# Altium schematic symbol library jlcpcb_2025_04_capacitors_extended_1210.schlib: 709 symbols (part 1 of 4) (continued)
## 1210B684K101CT
designator C?  Capacitance: 680nF  (hidden comment: *)
Capacitor, Ceramic (MLCC), 680nF, ±10%, 100V, X7R, ±10%, SMD 1210; Manufacturer: Walsin Tech Corp; Manufacturer Part Number: 1210B684K101CT; Package Size: 1210; JLCPCB Basic Part: No; JLCPCB Part Number: C2992624; Supplier 1: LCSC; Category: Capacitors - MLCC; Supplier Part Number 1: C2992624; Tolerance: ±10%; Voltage Rating: 100V; Temperature Coefficient: X7R; RoHS: Yes; ComponentLink1Description: Datasheet; ComponentLink1URL: https://wmsc.lcsc.com/wmsc/upload/file/pdf/v2/lcsc/2204121445_Walsin-Tech-Corp-1210B684K101CT_C2992624.pdf; ComponentLink2Description: JLCPCB Part URL; ComponentLink2URL: https://jlcpcb.com/partdetail/C2992624; ComponentLink3Description: LCSC Part URL; ComponentLink3URL: https://lcsc.com/product-detail/Multilayer-Ceramic-Capacitors-MLCC---SMD-SMT_Walsin-Tech-Corp-Walsin-Tech-Corp-1210B684K101CT_C2992624.html
footprint CAP-1210 (1210 (3225M) Capacitor)
pins: 1, 2

## 1210CG102J501NT
designator C?  Capacitance: 1nF  (hidden comment: *)
Capacitor, Ceramic (MLCC), 1nF, 500V, C0G, SMD 1210; Manufacturer: FH (Guangdong Fenghua Advanced Tech); Manufacturer Part Number: 1210CG102J501NT; Package Size: 1210; JLCPCB Basic Part: No; JLCPCB Part Number: C3037675; Supplier 1: LCSC; Category: Capacitors - MLCC; Supplier Part Number 1: C3037675; Voltage Rating: 500V; Temperature Coefficient: C0G; RoHS: Yes; ComponentLink1Description: Datasheet; ComponentLink1URL: https://wmsc.lcsc.com/wmsc/upload/file/pdf/v2/lcsc/2206171645_FH--Guangdong-Fenghua-Advanced-Tech-1210CG102J501NT_C3037675.pdf; ComponentLink2Description: JLCPCB Part URL; ComponentLink2URL: https://jlcpcb.com/partdetail/C3037675; ComponentLink3Description: LCSC Part URL; ComponentLink3URL: https://lcsc.com/product-detail/Multilayer-Ceramic-Capacitors-MLCC---SMD-SMT_FH-Guangdong-Fenghua-Advanced-Tech-FH-Guangdong-Fenghua-Advanced-Tech-1210CG102J501NT_C3037675.html
footprint CAP-1210 (1210 (3225M) Capacitor)
pins: 1, 2

## 1210CG681J102NT
designator C?  Capacitance: 680pF  (hidden comment: *)
Capacitor, Ceramic (MLCC), 680pF, ±5%, 1kV, C0G, ±5%, SMD 1210; Manufacturer: FH (Guangdong Fenghua Advanced Tech); Manufacturer Part Number: 1210CG681J102NT; Package Size: 1210; JLCPCB Basic Part: No; JLCPCB Part Number: C3037676; Supplier 1: LCSC; Category: Capacitors - MLCC; Supplier Part Number 1: C3037676; Tolerance: ±5%; Voltage Rating: 1kV; Temperature Coefficient: C0G; RoHS: Yes; ComponentLink1Description: Datasheet; ComponentLink1URL: https://wmsc.lcsc.com/wmsc/upload/file/pdf/v2/lcsc/2206171645_FH--Guangdong-Fenghua-Advanced-Tech-1210CG681J102NT_C3037676.pdf; ComponentLink2Description: JLCPCB Part URL; ComponentLink2URL: https://jlcpcb.com/partdetail/C3037676; ComponentLink3Description: LCSC Part URL; ComponentLink3URL: https://lcsc.com/product-detail/Multilayer-Ceramic-Capacitors-MLCC---SMD-SMT_FH-Guangdong-Fenghua-Advanced-Tech-FH-Guangdong-Fenghua-Advanced-Tech-1210CG681J102NT_C3037676.html
footprint CAP-1210 (1210 (3225M) Capacitor)
pins: 1, 2

## 1210DD105KAT2A
designator C?  Capacitance: 1uF  (hidden comment: *)
Capacitor, Ceramic (MLCC), 1uF, ±10%, 35V, X5R, ±10%, SMD 1210; Manufacturer: Kyocera AVX; Manufacturer Part Number: 1210DD105KAT2A; Package Size: 1210; JLCPCB Basic Part: No; JLCPCB Part Number: C2175253; Supplier 1: LCSC; Category: Capacitors - MLCC; Supplier Part Number 1: C2175253; Tolerance: ±10%; Voltage Rating: 35V; Temperature Coefficient: X5R; RoHS: Yes; ComponentLink1Description: Datasheet; ComponentLink1URL: https://wmsc.lcsc.com/wmsc/upload/file/pdf/v2/lcsc/2304140030_Kyocera-AVX-1210DD105KAT2A_C2175253.pdf; ComponentLink2Description: JLCPCB Part URL; ComponentLink2URL: https://jlcpcb.com/partdetail/C2175253; ComponentLink3Description: LCSC Part URL; ComponentLink3URL: https://lcsc.com/product-detail/Multilayer-Ceramic-Capacitors-MLCC---SMD-SMT_Kyocera-AVX-Kyocera-AVX-1210DD105KAT2A_C2175253.html
footprint CAP-1210 (1210 (3225M) Capacitor)
pins: 1, 2

## 1210F106M100NT
designator C?  Capacitance: 10uF  (hidden comment: *)
Capacitor, Ceramic (MLCC), 10uF, ±20%, 10V, ±20%, SMD 1210; Manufacturer: FH(Guangdong Fenghua Advanced Tech); Manufacturer Part Number: 1210F106M100NT; Package Size: 1210; JLCPCB Basic Part: No; JLCPCB Part Number: C967607; Supplier 1: LCSC; Category: Capacitors - MLCC; Supplier Part Number 1: C967607; Tolerance: ±20%; Voltage Rating: 10V; RoHS: Yes; ComponentLink1Description: Datasheet; ComponentLink1URL: https://wmsc.lcsc.com/wmsc/upload/file/pdf/v2/lcsc/2304140030_FH--Guangdong-Fenghua-Advanced-Tech-1210F106M100NT_C967607.pdf; ComponentLink2Description: JLCPCB Part URL; ComponentLink2URL: https://jlcpcb.com/partdetail/C967607; ComponentLink3Description: LCSC Part URL; ComponentLink3URL: https://lcsc.com/product-detail/Multilayer-Ceramic-Capacitors-MLCC---SMD-SMT_FH-Guangdong-Fenghua-Advanced-Tech-FH-Guangdong-Fenghua-Advanced-Tech-1210F106M100NT_C967607.html
footprint CAP-1210 (1210 (3225M) Capacitor)
pins: 1, 2

## 1210F106M160NT
designator C?  Capacitance: 10uF  (hidden comment: *)
Capacitor, Ceramic (MLCC), 10uF, ±20%, 16V, Y5V, ±20%, SMD 1210; Manufacturer: FH(Guangdong Fenghua Advanced Tech); Manufacturer Part Number: 1210F106M160NT; Package Size: 1210; JLCPCB Basic Part: No; JLCPCB Part Number: C161634; Supplier 1: LCSC; Category: Capacitors - MLCC; Supplier Part Number 1: C161634; Tolerance: ±20%; Voltage Rating: 16V; Temperature Coefficient: Y5V; RoHS: Yes; ComponentLink1Description: Datasheet; ComponentLink1URL: https://wmsc.lcsc.com/wmsc/upload/file/pdf/v2/lcsc/2304140030_FH--Guangdong-Fenghua-Advanced-Tech-1210F106M160NT_C161634.pdf; ComponentLink2Description: JLCPCB Part URL; ComponentLink2URL: https://jlcpcb.com/partdetail/C161634; ComponentLink3Description: LCSC Part URL; ComponentLink3URL: https://lcsc.com/product-detail/Multilayer-Ceramic-Capacitors-MLCC---SMD-SMT_FH-Guangdong-Fenghua-Advanced-Tech-FH-Guangdong-Fenghua-Advanced-Tech-1210F106M160NT_C161634.html
footprint CAP-1210 (1210 (3225M) Capacitor)
pins: 1, 2

## 1210F106M250NT
designator C?  Capacitance: 10uF  (hidden comment: *)
Capacitor, Ceramic (MLCC), 10uF, ±20%, 25V, Y5V, ±20%, SMD 1210; Manufacturer: FH(Guangdong Fenghua Advanced Tech); Manufacturer Part Number: 1210F106M250NT; Package Size: 1210; JLCPCB Basic Part: No; JLCPCB Part Number: C161633; Supplier 1: LCSC; Category: Capacitors - MLCC; Supplier Part Number 1: C161633; Tolerance: ±20%; Voltage Rating: 25V; Temperature Coefficient: Y5V; RoHS: Yes; ComponentLink1Description: Datasheet; ComponentLink1URL: https://wmsc.lcsc.com/wmsc/upload/file/pdf/v2/lcsc/2304140030_FH--Guangdong-Fenghua-Advanced-Tech-1210F106M250NT_C161633.pdf; ComponentLink2Description: JLCPCB Part URL; ComponentLink2URL: https://jlcpcb.com/partdetail/C161633; ComponentLink3Description: LCSC Part URL; ComponentLink3URL: https://lcsc.com/product-detail/Multilayer-Ceramic-Capacitors-MLCC---SMD-SMT_FH-Guangdong-Fenghua-Advanced-Tech-FH-Guangdong-Fenghua-Advanced-Tech-1210F106M250NT_C161633.html
footprint CAP-1210 (1210 (3225M) Capacitor)
pins: 1, 2

## 1210F106M500NT
designator C?  Capacitance: 10uF  (hidden comment: *)
Capacitor, Ceramic (MLCC), 10uF, ±20%, 50V, Y5V, ±20%, SMD 1210; Manufacturer: FH(Guangdong Fenghua Advanced Tech); Manufacturer Part Number: 1210F106M500NT; Package Size: 1210; JLCPCB Basic Part: No; JLCPCB Part Number: C171750; Supplier 1: LCSC; Category: Capacitors - MLCC; Supplier Part Number 1: C171750; Tolerance: ±20%; Voltage Rating: 50V; Temperature Coefficient: Y5V; RoHS: Yes; ComponentLink1Description: Datasheet; ComponentLink1URL: https://wmsc.lcsc.com/wmsc/upload/file/pdf/v2/lcsc/2304140030_FH--Guangdong-Fenghua-Advanced-Tech-1210F106M500NT_C171750.pdf; ComponentLink2Description: JLCPCB Part URL; ComponentLink2URL: https://jlcpcb.com/partdetail/C171750; ComponentLink3Description: LCSC Part URL; ComponentLink3URL: https://lcsc.com/product-detail/Multilayer-Ceramic-Capacitors-MLCC---SMD-SMT_FH-Guangdong-Fenghua-Advanced-Tech-FH-Guangdong-Fenghua-Advanced-Tech-1210F106M500NT_C171750.html
footprint CAP-1210 (1210 (3225M) Capacitor)
pins: 1, 2

## 1210F226M250NT
designator C?  Capacitance: 22uF  (hidden comment: *)
Capacitor, Ceramic (MLCC), 22uF, ±20%, 25V, Y5V, ±20%, SMD 1210; Manufacturer: FH(Guangdong Fenghua Advanced Tech); Manufacturer Part Number: 1210F226M250NT; Package Size: 1210; JLCPCB Basic Part: No; JLCPCB Part Number: C165877; Supplier 1: LCSC; Category: Capacitors - MLCC; Supplier Part Number 1: C165877; Tolerance: ±20%; Voltage Rating: 25V; Temperature Coefficient: Y5V; RoHS: Yes; ComponentLink1Description: Datasheet; ComponentLink1URL: https://wmsc.lcsc.com/wmsc/upload/file/pdf/v2/lcsc/2304140030_FH--Guangdong-Fenghua-Advanced-Tech-1210F226M250NT_C165877.pdf; ComponentLink2Description: JLCPCB Part URL; ComponentLink2URL: https://jlcpcb.com/partdetail/C165877; ComponentLink3Description: LCSC Part URL; ComponentLink3URL: https://lcsc.com/product-detail/Multilayer-Ceramic-Capacitors-MLCC---SMD-SMT_FH-Guangdong-Fenghua-Advanced-Tech-FH-Guangdong-Fenghua-Advanced-Tech-1210F226M250NT_C165877.html
footprint CAP-1210 (1210 (3225M) Capacitor)
pins: 1, 2

## 1210F475Z500CT
designator C?  Capacitance: 4.7uF  (hidden comment: *)
Capacitor, Ceramic (MLCC), 4.7uF, 50V, Y5V, SMD 1210; Manufacturer: Walsin Tech Corp; Manufacturer Part Number: 1210F475Z500CT; Temperature Rating: -20%~+80%; Package Size: 1210; JLCPCB Basic Part: No; JLCPCB Part Number: C515689; Supplier 1: LCSC; Category: Capacitors - MLCC; Supplier Part Number 1: C515689; Voltage Rating: 50V; Temperature Coefficient: Y5V; RoHS: Yes; ComponentLink1Description: Datasheet; ComponentLink1URL: https://wmsc.lcsc.com/wmsc/upload/file/pdf/v2/lcsc/2304140030_Walsin-Tech-Corp-1210F475Z500CT_C515689.pdf; ComponentLink2Description: JLCPCB Part URL; ComponentLink2URL: https://jlcpcb.com/partdetail/C515689; ComponentLink3Description: LCSC Part URL; ComponentLink3URL: https://lcsc.com/product-detail/Multilayer-Ceramic-Capacitors-MLCC---SMD-SMT_Walsin-Tech-Corp-Walsin-Tech-Corp-1210F475Z500CT_C515689.html
footprint CAP-1210 (1210 (3225M) Capacitor)
pins: 1, 2

## 1210GC102KAT1A
designator C?  Capacitance: 1nF  (hidden comment: *)
Capacitor, Ceramic (MLCC), 1nF, ±10%, 2kV, X7R, ±10%, SMD 1210; Manufacturer: AVX; Manufacturer Part Number: 1210GC102KAT1A; Package Size: 1210; JLCPCB Basic Part: No; JLCPCB Part Number: C597599; Supplier 1: LCSC; Category: Capacitors - MLCC; Supplier Part Number 1: C597599; Tolerance: ±10%; Voltage Rating: 2kV; Temperature Coefficient: X7R; RoHS: Yes; ComponentLink1Description: Datasheet; ComponentLink1URL: https://wmsc.lcsc.com/wmsc/upload/file/pdf/v2/lcsc/2304140030_Kyocera-AVX-1210GC102KAT1A_C597599.pdf; ComponentLink2Description: JLCPCB Part URL; ComponentLink2URL: https://jlcpcb.com/partdetail/C597599; ComponentLink3Description: LCSC Part URL; ComponentLink3URL: https://lcsc.com/product-detail/Multilayer-Ceramic-Capacitors-MLCC---SMD-SMT_Kyocera-AVX-Kyocera-AVX-1210GC102KAT1A_C597599.html
footprint CAP-1210 (1210 (3225M) Capacitor)
pins: 1, 2

## 1210GC102KAT2A
designator C?  Capacitance: 1nF  (hidden comment: *)
Capacitor, Ceramic (MLCC), 1nF, ±10%, 2kV, X7R, ±10%, SMD 1210; Manufacturer: Kyocera AVX; Manufacturer Part Number: 1210GC102KAT2A; Package Size: 1210; JLCPCB Basic Part: No; JLCPCB Part Number: C2173108; Supplier 1: LCSC; Category: Capacitors - MLCC; Supplier Part Number 1: C2173108; Tolerance: ±10%; Voltage Rating: 2kV; Temperature Coefficient: X7R; RoHS: Yes; ComponentLink1Description: Datasheet; ComponentLink1URL: https://wmsc.lcsc.com/wmsc/upload/file/pdf/v2/lcsc/2309151035_Kyocera-AVX-1210GC102KAT2A_C2173108.pdf; ComponentLink2Description: JLCPCB Part URL; ComponentLink2URL: https://jlcpcb.com/partdetail/C2173108; ComponentLink3Description: LCSC Part URL; ComponentLink3URL: https://lcsc.com/product-detail/Multilayer-Ceramic-Capacitors-MLCC---SMD-SMT_Kyocera-AVX-Kyocera-AVX-1210GC102KAT2A_C2173108.html
footprint CAP-1210 (1210 (3225M) Capacitor)
pins: 1, 2

## 1210J6300473KXT
designator C?  Capacitance: 47nF  (hidden comment: *)
Capacitor, Ceramic (MLCC), 47nF, ±10%, 630V, X7R, ±10%, SMD 1210; Manufacturer: Knowles; Manufacturer Part Number: 1210J6300473KXT; Package Size: 1210; JLCPCB Basic Part: No; JLCPCB Part Number: C340572; Supplier 1: LCSC; Category: Capacitors - MLCC; Supplier Part Number 1: C340572; Tolerance: ±10%; Voltage Rating: 630V; Temperature Coefficient: X7R; RoHS: Yes; ComponentLink1Description: Datasheet; ComponentLink1URL: https://wmsc.lcsc.com/wmsc/upload/file/pdf/v2/lcsc/1912111437_Knowles-1210J6300473KXT_C340572.pdf; ComponentLink2Description: JLCPCB Part URL; ComponentLink2URL: https://jlcpcb.com/partdetail/C340572; ComponentLink3Description: LCSC Part URL; ComponentLink3URL: https://lcsc.com/product-detail/Multilayer-Ceramic-Capacitors-MLCC---SMD-SMT_Knowles-Knowles-1210J6300473KXT_C340572.html
footprint CAP-1210 (1210 (3225M) Capacitor)
pins: 1, 2

## 1210J6300683KJT
designator C?  Capacitance: 68nF  (hidden comment: *)
Capacitor, Ceramic (MLCC), 68nF, ±10%, 630V, X7R, ±10%, SMD 1210; Manufacturer: Knowles; Manufacturer Part Number: 1210J6300683KJT; Package Size: 1210; JLCPCB Basic Part: No; JLCPCB Part Number: C340540; Supplier 1: LCSC; Category: Capacitors - MLCC; Supplier Part Number 1: C340540; Tolerance: ±10%; Voltage Rating: 630V; Temperature Coefficient: X7R; RoHS: Yes; ComponentLink1Description: Datasheet; ComponentLink1URL: https://wmsc.lcsc.com/wmsc/upload/file/pdf/v2/lcsc/1912111437_Knowles-1210J6300683KJT_C340540.pdf; ComponentLink2Description: JLCPCB Part URL; ComponentLink2URL: https://jlcpcb.com/partdetail/C340540; ComponentLink3Description: LCSC Part URL; ComponentLink3URL: https://lcsc.com/product-detail/Multilayer-Ceramic-Capacitors-MLCC---SMD-SMT_Knowles-Knowles-1210J6300683KJT_C340540.html
footprint CAP-1210 (1210 (3225M) Capacitor)
pins: 1, 2

## 1210N151J202CT
designator C?  Capacitance: 150pF  (hidden comment: *)
Capacitor, Ceramic (MLCC), 150pF, ±5%, 2kV, NP0, ±5%, SMD 1210; Manufacturer: Walsin Tech Corp; Manufacturer Part Number: 1210N151J202CT; Package Size: 1210; JLCPCB Basic Part: No; JLCPCB Part Number: C880764; Supplier 1: LCSC; Category: Capacitors - MLCC; Supplier Part Number 1: C880764; Tolerance: ±5%; Voltage Rating: 2kV; Temperature Coefficient: NP0; RoHS: Yes; ComponentLink1Description: Datasheet; ComponentLink1URL: https://wmsc.lcsc.com/wmsc/upload/file/pdf/v2/lcsc/2304140030_Walsin-Tech-Corp-1210N151J202CT_C880764.pdf; ComponentLink2Description: JLCPCB Part URL; ComponentLink2URL: https://jlcpcb.com/partdetail/C880764; ComponentLink3Description: LCSC Part URL; ComponentLink3URL: https://lcsc.com/product-detail/Multilayer-Ceramic-Capacitors-MLCC---SMD-SMT_Walsin-Tech-Corp-Walsin-Tech-Corp-1210N151J202CT_C880764.html
footprint CAP-1210 (1210 (3225M) Capacitor)
pins: 1, 2

## 1210N221J102CT
designator C?  Capacitance: 220pF  (hidden comment: *)
Capacitor, Ceramic (MLCC), 220pF, ±5%, 1kV, NP0, ±5%, SMD 1210; Manufacturer: Walsin Tech Corp; Manufacturer Part Number: 1210N221J102CT; Package Size: 1210; JLCPCB Basic Part: No; JLCPCB Part Number: C396817; Supplier 1: LCSC; Category: Capacitors - MLCC; Supplier Part Number 1: C396817; Tolerance: ±5%; Voltage Rating: 1kV; Temperature Coefficient: NP0; RoHS: Yes; ComponentLink1Description: Datasheet; ComponentLink1URL: https://wmsc.lcsc.com/wmsc/upload/file/pdf/v2/lcsc/2304140030_Walsin-Tech-Corp-1210N221J102CT_C396817.pdf; ComponentLink2Description: JLCPCB Part URL; ComponentLink2URL: https://jlcpcb.com/partdetail/C396817; ComponentLink3Description: LCSC Part URL; ComponentLink3URL: https://lcsc.com/product-detail/Multilayer-Ceramic-Capacitors-MLCC---SMD-SMT_Walsin-Tech-Corp-Walsin-Tech-Corp-1210N221J102CT_C396817.html
footprint CAP-1210 (1210 (3225M) Capacitor)
pins: 1, 2

## 1210N221J500CT
designator C?  Capacitance: 220pF  (hidden comment: *)
Capacitor, Ceramic (MLCC), 220pF, ±5%, 50V, NP0, ±5%, SMD 1210; Manufacturer: Walsin Tech Corp; Manufacturer Part Number: 1210N221J500CT; Package Size: 1210; JLCPCB Basic Part: No; JLCPCB Part Number: C469649; Supplier 1: LCSC; Category: Capacitors - MLCC; Supplier Part Number 1: C469649; Tolerance: ±5%; Voltage Rating: 50V; Temperature Coefficient: NP0; RoHS: Yes; ComponentLink1Description: Datasheet; ComponentLink1URL: https://wmsc.lcsc.com/wmsc/upload/file/pdf/v2/lcsc/2304140030_Walsin-Tech-Corp-1210N221J500CT_C469649.pdf; ComponentLink2Description: JLCPCB Part URL; ComponentLink2URL: https://jlcpcb.com/partdetail/C469649; ComponentLink3Description: LCSC Part URL; ComponentLink3URL: https://lcsc.com/product-detail/Multilayer-Ceramic-Capacitors-MLCC---SMD-SMT_Walsin-Tech-Corp-Walsin-Tech-Corp-1210N221J500CT_C469649.html
footprint CAP-1210 (1210 (3225M) Capacitor)
pins: 1, 2

## 1210X106K160CT
designator C?  Capacitance: 10uF  (hidden comment: *)
Capacitor, Ceramic (MLCC), 10uF, ±10%, 16V, X5R, ±10%, SMD 1210; Manufacturer: Walsin Tech Corp; Manufacturer Part Number: 1210X106K160CT; Package Size: 1210; JLCPCB Basic Part: No; JLCPCB Part Number: C304026; Supplier 1: LCSC; Category: Capacitors - MLCC; Supplier Part Number 1: C304026; Tolerance: ±10%; Voltage Rating: 16V; Temperature Coefficient: X5R; RoHS: Yes; ComponentLink1Description: Datasheet; ComponentLink1URL: https://wmsc.lcsc.com/wmsc/upload/file/pdf/v2/lcsc/2304140030_Walsin-Tech-Corp-1210X106K160CT_C304026.pdf; ComponentLink2Description: JLCPCB Part URL; ComponentLink2URL: https://jlcpcb.com/partdetail/C304026; ComponentLink3Description: LCSC Part URL; ComponentLink3URL: https://lcsc.com/product-detail/Multilayer-Ceramic-Capacitors-MLCC---SMD-SMT_Walsin-Tech-Corp-Walsin-Tech-Corp-1210X106K160CT_C304026.html
footprint CAP-1210 (1210 (3225M) Capacitor)
pins: 1, 2

## 1210X106K160NT
designator C?  Capacitance: 10000000pF  (hidden comment: *)
Capacitor, Ceramic (MLCC), 10000000pF, ±10%, 16V, X5R, ±10%, SMD 1210; Manufacturer: FH (Guangdong Fenghua Advanced Tech); Manufacturer Part Number: 1210X106K160NT; Package Size: 1210; JLCPCB Basic Part: No; JLCPCB Part Number: C962232; Supplier 1: LCSC; Category: Capacitors - MLCC; Supplier Part Number 1: C962232; Tolerance: ±10%; Voltage Rating: 16V; Temperature Coefficient: X5R; RoHS: Yes; ComponentLink1Description: Datasheet; ComponentLink1URL: https://wmsc.lcsc.com/wmsc/upload/file/pdf/v2/lcsc/2304140030_FH--Guangdong-Fenghua-Advanced-Tech-1210X106K160NT_C962232.pdf; ComponentLink2Description: JLCPCB Part URL; ComponentLink2URL: https://jlcpcb.com/partdetail/C962232; ComponentLink3Description: LCSC Part URL; ComponentLink3URL: https://lcsc.com/product-detail/Multilayer-Ceramic-Capacitors-MLCC---SMD-SMT_FH-Guangdong-Fenghua-Advanced-Tech-FH-Guangdong-Fenghua-Advanced-Tech-1210X106K160NT_C962232.html
footprint CAP-1210 (1210 (3225M) Capacitor)
pins: 1, 2

## 1210X106K250CT
designator C?  Capacitance: 10uF  (hidden comment: *)
Capacitor, Ceramic (MLCC), 10uF, ±10%, 25V, X5R, ±10%, SMD 1210; Manufacturer: Walsin Tech Corp; Manufacturer Part Number: 1210X106K250CT; Package Size: 1210; JLCPCB Basic Part: No; JLCPCB Part Number: C2909421; Supplier 1: LCSC; Category: Capacitors - MLCC; Supplier Part Number 1: C2909421; Tolerance: ±10%; Voltage Rating: 25V; Temperature Coefficient: X5R; RoHS: Yes; ComponentLink1Description: Datasheet; ComponentLink1URL: https://wmsc.lcsc.com/wmsc/upload/file/pdf/v2/lcsc/2110272130_Walsin-Tech-Corp-1210X106K250CT_C2909421.pdf; ComponentLink2Description: JLCPCB Part URL; ComponentLink2URL: https://jlcpcb.com/partdetail/C2909421; ComponentLink3Description: LCSC Part URL; ComponentLink3URL: https://lcsc.com/product-detail/Multilayer-Ceramic-Capacitors-MLCC---SMD-SMT_Walsin-Tech-Corp-Walsin-Tech-Corp-1210X106K250CT_C2909421.html
footprint CAP-1210 (1210 (3225M) Capacitor)
pins: 1, 2

## 1210X106K250NT
designator C?  Capacitance: 10uF  (hidden comment: *)
Capacitor, Ceramic (MLCC), 10uF, ±10%, 25V, X5R, ±10%, SMD 1210; Manufacturer: FH(Guangdong Fenghua Advanced Tech); Manufacturer Part Number: 1210X106K250NT; Package Size: 1210; JLCPCB Basic Part: No; JLCPCB Part Number: C170074; Supplier 1: LCSC; Category: Capacitors - MLCC; Supplier Part Number 1: C170074; Tolerance: ±10%; Voltage Rating: 25V; Temperature Coefficient: X5R; RoHS: Yes; ComponentLink1Description: Datasheet; ComponentLink1URL: https://wmsc.lcsc.com/wmsc/upload/file/pdf/v2/lcsc/2304140030_FH--Guangdong-Fenghua-Advanced-Tech-1210X106K250NT_C170074.pdf; ComponentLink2Description: JLCPCB Part URL; ComponentLink2URL: https://jlcpcb.com/partdetail/C170074; ComponentLink3Description: LCSC Part URL; ComponentLink3URL: https://lcsc.com/product-detail/Multilayer-Ceramic-Capacitors-MLCC---SMD-SMT_FH-Guangdong-Fenghua-Advanced-Tech-FH-Guangdong-Fenghua-Advanced-Tech-1210X106K250NT_C170074.html
footprint CAP-1210 (1210 (3225M) Capacitor)
pins: 1, 2

## 1210X106K350CT
designator C?  Capacitance: 10uF  (hidden comment: *)
Capacitor, Ceramic (MLCC), 10uF, X5R, SMD 1210; Manufacturer: Walsin Tech Corp; Manufacturer Part Number: 1210X106K350CT; Package Size: 1210; JLCPCB Basic Part: No; JLCPCB Part Number: C4555503; Supplier 1: LCSC; Category: Capacitors - MLCC; Supplier Part Number 1: C4555503; Temperature Coefficient: X5R; RoHS: Yes; ComponentLink1Description: Datasheet; ComponentLink1URL: https://wmsc.lcsc.com/wmsc/upload/file/pdf/v2/lcsc/2207111830_Walsin-Tech-Corp-1210X106K350CT_C4555503.pdf; ComponentLink2Description: JLCPCB Part URL; ComponentLink2URL: https://jlcpcb.com/partdetail/C4555503; ComponentLink3Description: LCSC Part URL; ComponentLink3URL: https://lcsc.com/product-detail/Multilayer-Ceramic-Capacitors-MLCC---SMD-SMT_Walsin-Tech-Corp-Walsin-Tech-Corp-1210X106K350CT_C4555503.html
footprint CAP-1210 (1210 (3225M) Capacitor)
pins: 1, 2

## 1210X106K500CT
designator C?  Capacitance: 10uF  (hidden comment: *)
Capacitor, Ceramic (MLCC), 10uF, ±10%, 50V, X5R, ±10%, SMD 1210; Manufacturer: Walsin Tech Corp; Manufacturer Part Number: 1210X106K500CT; Package Size: 1210; JLCPCB Basic Part: No; JLCPCB Part Number: C296120; Supplier 1: LCSC; Category: Capacitors - MLCC; Supplier Part Number 1: C296120; Tolerance: ±10%; Voltage Rating: 50V; Temperature Coefficient: X5R; RoHS: Yes; ComponentLink1Description: Datasheet; ComponentLink1URL: https://wmsc.lcsc.com/wmsc/upload/file/pdf/v2/lcsc/2304140030_Walsin-Tech-Corp-1210X106K500CT_C296120.pdf; ComponentLink2Description: JLCPCB Part URL; ComponentLink2URL: https://jlcpcb.com/partdetail/C296120; ComponentLink3Description: LCSC Part URL; ComponentLink3URL: https://lcsc.com/product-detail/Multilayer-Ceramic-Capacitors-MLCC---SMD-SMT_Walsin-Tech-Corp-Walsin-Tech-Corp-1210X106K500CT_C296120.html
footprint CAP-1210 (1210 (3225M) Capacitor)
pins: 1, 2

## 1210X106K500NT
designator C?  Capacitance: 10uF  (hidden comment: *)
Capacitor, Ceramic (MLCC), 10uF, ±10%, 50V, X5R, ±10%, SMD 1210; Manufacturer: FH(Guangdong Fenghua Advanced Tech); Manufacturer Part Number: 1210X106K500NT; Package Size: 1210; JLCPCB Basic Part: No; JLCPCB Part Number: C576234; Supplier 1: LCSC; Category: Capacitors - MLCC; Supplier Part Number 1: C576234; Tolerance: ±10%; Voltage Rating: 50V; Temperature Coefficient: X5R; RoHS: Yes; ComponentLink1Description: Datasheet; ComponentLink1URL: https://wmsc.lcsc.com/wmsc/upload/file/pdf/v2/lcsc/2304140030_FH--Guangdong-Fenghua-Advanced-Tech-1210X106K500NT_C576234.pdf; ComponentLink2Description: JLCPCB Part URL; ComponentLink2URL: https://jlcpcb.com/partdetail/C576234; ComponentLink3Description: LCSC Part URL; ComponentLink3URL: https://lcsc.com/product-detail/Multilayer-Ceramic-Capacitors-MLCC---SMD-SMT_FH-Guangdong-Fenghua-Advanced-Tech-FH-Guangdong-Fenghua-Advanced-Tech-1210X106K500NT_C576234.html
footprint CAP-1210 (1210 (3225M) Capacitor)
pins: 1, 2

## 1210X107M6R3CT
designator C?  Capacitance: 100uF  (hidden comment: *)
Capacitor, Ceramic (MLCC), 100uF, ±20%, 6.3V, X5R, ±20%, SMD 1210; Manufacturer: Walsin Tech Corp; Manufacturer Part Number: 1210X107M6R3CT; Package Size: 1210; JLCPCB Basic Part: No; JLCPCB Part Number: C509278; Supplier 1: LCSC; Category: Capacitors - MLCC; Supplier Part Number 1: C509278; Tolerance: ±20%; Voltage Rating: 6.3V; Temperature Coefficient: X5R; RoHS: Yes; ComponentLink1Description: Datasheet; ComponentLink1URL: https://wmsc.lcsc.com/wmsc/upload/file/pdf/v2/lcsc/2304140030_Walsin-Tech-Corp-1210X107M6R3CT_C509278.pdf; ComponentLink2Description: JLCPCB Part URL; ComponentLink2URL: https://jlcpcb.com/partdetail/C509278; ComponentLink3Description: LCSC Part URL; ComponentLink3URL: https://lcsc.com/product-detail/Multilayer-Ceramic-Capacitors-MLCC---SMD-SMT_Walsin-Tech-Corp-Walsin-Tech-Corp-1210X107M6R3CT_C509278.html
footprint CAP-1210 (1210 (3225M) Capacitor)
pins: 1, 2

## 1210X107M6R3NT
designator C?  Capacitance: 100uF  (hidden comment: *)
Capacitor, Ceramic (MLCC), 100uF, ±20%, 6.3V, X5R, ±20%, SMD 1210; Manufacturer: FH (Guangdong Fenghua Advanced Tech); Manufacturer Part Number: 1210X107M6R3NT; Package Size: 1210; JLCPCB Basic Part: No; JLCPCB Part Number: C5445359; Supplier 1: LCSC; Category: Capacitors - MLCC; Supplier Part Number 1: C5445359; Tolerance: ±20%; Voltage Rating: 6.3V; Temperature Coefficient: X5R; RoHS: Yes; ComponentLink1Description: Datasheet; ComponentLink1URL: https://wmsc.lcsc.com/wmsc/upload/file/pdf/v2/lcsc/2304271702_FH--Guangdong-Fenghua-Advanced-Tech-1210X107M6R3NT_C5445359.pdf; ComponentLink2Description: JLCPCB Part URL; ComponentLink2URL: https://jlcpcb.com/partdetail/C5445359; ComponentLink3Description: LCSC Part URL; ComponentLink3URL: https://lcsc.com/product-detail/Multilayer-Ceramic-Capacitors-MLCC---SMD-SMT_FH-Guangdong-Fenghua-Advanced-Tech-FH-Guangdong-Fenghua-Advanced-Tech-1210X107M6R3NT_C5445359.html
footprint CAP-1210 (1210 (3225M) Capacitor)
pins: 1, 2

## 1210X226K160NT
designator C?  Capacitance: 22uF  (hidden comment: *)
Capacitor, Ceramic (MLCC), 22uF, ±10%, 16V, X5R, ±10%, SMD 1210; Manufacturer: FH(Guangdong Fenghua Advanced Tech); Manufacturer Part Number: 1210X226K160NT; Package Size: 1210; JLCPCB Basic Part: No; JLCPCB Part Number: C167328; Supplier 1: LCSC; Category: Capacitors - MLCC; Supplier Part Number 1: C167328; Tolerance: ±10%; Voltage Rating: 16V; Temperature Coefficient: X5R; RoHS: Yes; ComponentLink1Description: Datasheet; ComponentLink1URL: https://wmsc.lcsc.com/wmsc/upload/file/pdf/v2/lcsc/2304140030_FH--Guangdong-Fenghua-Advanced-Tech-1210X226K160NT_C167328.pdf; ComponentLink2Description: JLCPCB Part URL; ComponentLink2URL: https://jlcpcb.com/partdetail/C167328; ComponentLink3Description: LCSC Part URL; ComponentLink3URL: https://lcsc.com/product-detail/Multilayer-Ceramic-Capacitors-MLCC---SMD-SMT_FH-Guangdong-Fenghua-Advanced-Tech-FH-Guangdong-Fenghua-Advanced-Tech-1210X226K160NT_C167328.html
footprint CAP-1210 (1210 (3225M) Capacitor)
pins: 1, 2

## 1210X226K250CT
designator C?  Capacitance: 22uF  (hidden comment: *)
Capacitor, Ceramic (MLCC), 22uF, 25V, X5R, SMD 1210; Manufacturer: Walsin Tech Corp; Manufacturer Part Number: 1210X226K250CT; Package Size: 1210; JLCPCB Basic Part: No; JLCPCB Part Number: C2909442; Supplier 1: LCSC; Category: Capacitors - MLCC; Supplier Part Number 1: C2909442; Voltage Rating: 25V; Temperature Coefficient: X5R; RoHS: Yes; ComponentLink1Description: Datasheet; ComponentLink1URL: https://wmsc.lcsc.com/wmsc/upload/file/pdf/v2/lcsc/2110272130_Walsin-Tech-Corp-1210X226K250CT_C2909442.pdf; ComponentLink2Description: JLCPCB Part URL; ComponentLink2URL: https://jlcpcb.com/partdetail/C2909442; ComponentLink3Description: LCSC Part URL; ComponentLink3URL: https://lcsc.com/product-detail/Multilayer-Ceramic-Capacitors-MLCC---SMD-SMT_Walsin-Tech-Corp-Walsin-Tech-Corp-1210X226K250CT_C2909442.html
footprint CAP-1210 (1210 (3225M) Capacitor)
pins: 1, 2

## 1210X226M160CT
designator C?  Capacitance: 22uF  (hidden comment: *)
Capacitor, Ceramic (MLCC), 22uF, ±20%, 16V, X5R, ±20%, SMD 1210; Manufacturer: Walsin Tech Corp; Manufacturer Part Number: 1210X226M160CT; Package Size: 1210; JLCPCB Basic Part: No; JLCPCB Part Number: C237196; Supplier 1: LCSC; Category: Capacitors - MLCC; Supplier Part Number 1: C237196; Tolerance: ±20%; Voltage Rating: 16V; Temperature Coefficient: X5R; RoHS: Yes; ComponentLink1Description: Datasheet; ComponentLink1URL: https://wmsc.lcsc.com/wmsc/upload/file/pdf/v2/lcsc/2304140030_Walsin-Tech-Corp-1210X226M160CT_C237196.pdf; ComponentLink2Description: JLCPCB Part URL; ComponentLink2URL: https://jlcpcb.com/partdetail/C237196; ComponentLink3Description: LCSC Part URL; ComponentLink3URL: https://lcsc.com/product-detail/Multilayer-Ceramic-Capacitors-MLCC---SMD-SMT_Walsin-Tech-Corp-Walsin-Tech-Corp-1210X226M160CT_C237196.html
footprint CAP-1210 (1210 (3225M) Capacitor)
pins: 1, 2

## 1210X475K101NT
designator C?  Capacitance: 4.7uF  (hidden comment: *)
Capacitor, Ceramic (MLCC), 4.7uF, 100V, X5R, SMD 1210; Manufacturer: FH (Guangdong Fenghua Advanced Tech); Manufacturer Part Number: 1210X475K101NT; Package Size: 1210; JLCPCB Basic Part: No; JLCPCB Part Number: C2979983; Supplier 1: LCSC; Category: Capacitors - MLCC; Supplier Part Number 1: C2979983; Voltage Rating: 100V; Temperature Coefficient: X5R; RoHS: Yes; ComponentLink1Description: Datasheet; ComponentLink1URL: https://wmsc.lcsc.com/wmsc/upload/file/pdf/v2/lcsc/2203252253_FH--Guangdong-Fenghua-Advanced-Tech-1210X475K101NT_C2979983.pdf; ComponentLink2Description: JLCPCB Part URL; ComponentLink2URL: https://jlcpcb.com/partdetail/C2979983; ComponentLink3Description: LCSC Part URL; ComponentLink3URL: https://lcsc.com/product-detail/Multilayer-Ceramic-Capacitors-MLCC---SMD-SMT_FH-Guangdong-Fenghua-Advanced-Tech-FH-Guangdong-Fenghua-Advanced-Tech-1210X475K101NT_C2979983.html
footprint CAP-1210 (1210 (3225M) Capacitor)
pins: 1, 2

## 1210X476K6R3CT
designator C?  Capacitance: 47uF  (hidden comment: *)
Capacitor, Ceramic (MLCC), 47uF, ±10%, 6.3V, X5R, ±10%, SMD 1210; Manufacturer: Walsin Tech Corp; Manufacturer Part Number: 1210X476K6R3CT; Package Size: 1210; JLCPCB Basic Part: No; JLCPCB Part Number: C396816; Supplier 1: LCSC; Category: Capacitors - MLCC; Supplier Part Number 1: C396816; Tolerance: ±10%; Voltage Rating: 6.3V; Temperature Coefficient: X5R; RoHS: Yes; ComponentLink1Description: Datasheet; ComponentLink1URL: https://wmsc.lcsc.com/wmsc/upload/file/pdf/v2/lcsc/2304140030_Walsin-Tech-Corp-1210X476K6R3CT_C396816.pdf; ComponentLink2Description: JLCPCB Part URL; ComponentLink2URL: https://jlcpcb.com/partdetail/C396816; ComponentLink3Description: LCSC Part URL; ComponentLink3URL: https://lcsc.com/product-detail/Multilayer-Ceramic-Capacitors-MLCC---SMD-SMT_Walsin-Tech-Corp-Walsin-Tech-Corp-1210X476K6R3CT_C396816.html
footprint CAP-1210 (1210 (3225M) Capacitor)
pins: 1, 2

## 1210X476K100CT
designator C?  Capacitance: 47uF  (hidden comment: *)
Capacitor, Ceramic (MLCC), 47uF, ±10%, 10V, X5R, ±10%, SMD 1210; Manufacturer: Walsin Tech Corp; Manufacturer Part Number: 1210X476K100CT; Package Size: 1210; JLCPCB Basic Part: No; JLCPCB Part Number: C515690; Supplier 1: LCSC; Category: Capacitors - MLCC; Supplier Part Number 1: C515690; Tolerance: ±10%; Voltage Rating: 10V; Temperature Coefficient: X5R; RoHS: Yes; ComponentLink1Description: Datasheet; ComponentLink1URL: https://wmsc.lcsc.com/wmsc/upload/file/pdf/v2/lcsc/2304140030_Walsin-Tech-Corp-1210X476K100CT_C515690.pdf; ComponentLink2Description: JLCPCB Part URL; ComponentLink2URL: https://jlcpcb.com/partdetail/C515690; ComponentLink3Description: LCSC Part URL; ComponentLink3URL: https://lcsc.com/product-detail/Multilayer-Ceramic-Capacitors-MLCC---SMD-SMT_Walsin-Tech-Corp-Walsin-Tech-Corp-1210X476K100CT_C515690.html
footprint CAP-1210 (1210 (3225M) Capacitor)
pins: 1, 2

## 1210X476K160CT
designator C?  Capacitance: 47uF  (hidden comment: *)
Capacitor, Ceramic (MLCC), 47uF, ±10%, 16V, X5R, ±10%, SMD 1210; Manufacturer: Walsin Tech Corp; Manufacturer Part Number: 1210X476K160CT; Package Size: 1210; JLCPCB Basic Part: No; JLCPCB Part Number: C396815; Supplier 1: LCSC; Category: Capacitors - MLCC; Supplier Part Number 1: C396815; Tolerance: ±10%; Voltage Rating: 16V; Temperature Coefficient: X5R; RoHS: Yes; ComponentLink1Description: Datasheet; ComponentLink1URL: https://wmsc.lcsc.com/wmsc/upload/file/pdf/v2/lcsc/2304140030_Walsin-Tech-Corp-1210X476K160CT_C396815.pdf; ComponentLink2Description: JLCPCB Part URL; ComponentLink2URL: https://jlcpcb.com/partdetail/C396815; ComponentLink3Description: LCSC Part URL; ComponentLink3URL: https://lcsc.com/product-detail/Multilayer-Ceramic-Capacitors-MLCC---SMD-SMT_Walsin-Tech-Corp-Walsin-Tech-Corp-1210X476K160CT_C396815.html
footprint CAP-1210 (1210 (3225M) Capacitor)
pins: 1, 2

## 1210X476K160NT_C2961286
designator C?  Capacitance: 47uF  (hidden comment: *)
Capacitor, Ceramic (MLCC), 47uF, ±10%, 16V, X5R, ±10%, SMD 1210; Manufacturer: FH (Guangdong Fenghua Advanced Tech); Manufacturer Part Number: 1210X476K160NT; Package Size: 1210; JLCPCB Basic Part: No; JLCPCB Part Number: C2961286; Supplier 1: LCSC; Category: Capacitors - MLCC; Supplier Part Number 1: C2961286; Tolerance: ±10%; Voltage Rating: 16V; Temperature Coefficient: X5R; RoHS: Yes; ComponentLink1Description: Datasheet; ComponentLink1URL: https://wmsc.lcsc.com/wmsc/upload/file/pdf/v2/lcsc/2201211500_FH--Guangdong-Fenghua-Advanced-Tech-1210X476K160NT_C2961286.pdf; ComponentLink2Description: JLCPCB Part URL; ComponentLink2URL: https://jlcpcb.com/partdetail/C2961286; ComponentLink3Description: LCSC Part URL; ComponentLink3URL: https://lcsc.com/product-detail/Multilayer-Ceramic-Capacitors-MLCC---SMD-SMT_FH-Guangdong-Fenghua-Advanced-Tech-FH-Guangdong-Fenghua-Advanced-Tech-1210X476K160NT_C2961286.html
footprint CAP-1210 (1210 (3225M) Capacitor)
pins: 1, 2

## 1210X476K160NT_C5439216
designator C?  Capacitance: 47uF  (hidden comment: *)
Capacitor, Ceramic (MLCC), 47uF, ±10%, 16V, X5R, ±10%, SMD 1210; Manufacturer: FH (Guangdong Fenghua Advanced Tech); Manufacturer Part Number: 1210X476K160NT; Package Size: 1210; JLCPCB Basic Part: No; JLCPCB Part Number: C5439216; Supplier 1: LCSC; Category: Capacitors - MLCC; Supplier Part Number 1: C5439216; Tolerance: ±10%; Voltage Rating: 16V; Temperature Coefficient: X5R; RoHS: Yes; ComponentLink1Description: Datasheet; ComponentLink2Description: JLCPCB Part URL; ComponentLink2URL: https://jlcpcb.com/partdetail/C5439216; ComponentLink3Description: LCSC Part URL; ComponentLink3URL: https://lcsc.com/product-detail/Multilayer-Ceramic-Capacitors-MLCC---SMD-SMT_FH-Guangdong-Fenghua-Advanced-Tech-FH-Guangdong-Fenghua-Advanced-Tech-1210X476K160NT_C5439216.html
footprint CAP-1210 (1210 (3225M) Capacitor)
pins: 1, 2

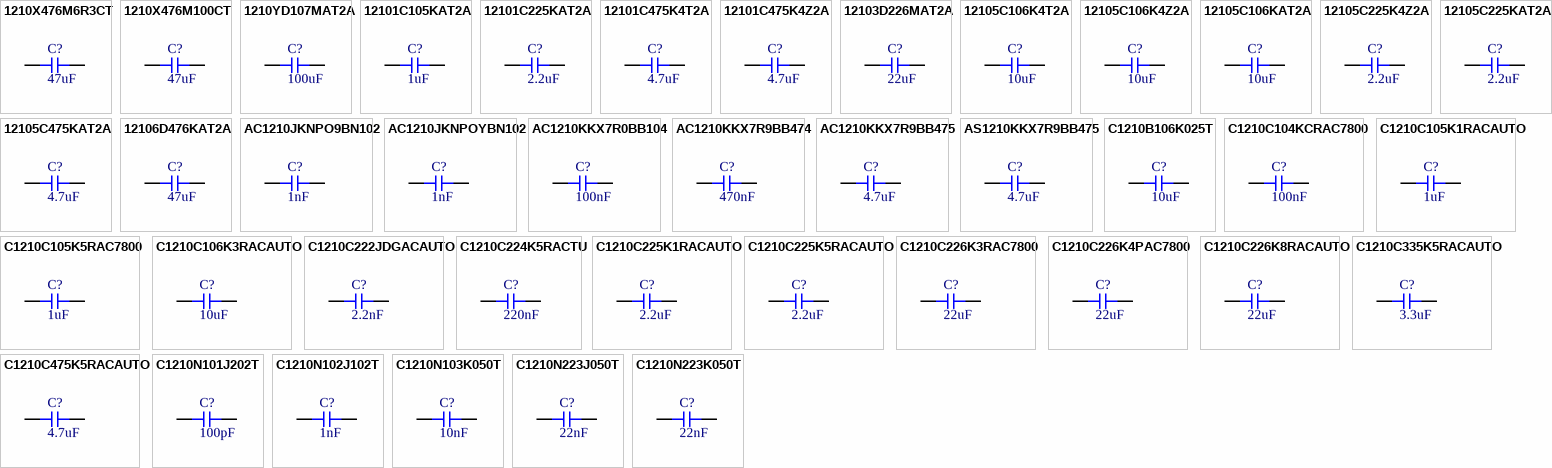
[diagram p3: symbols 1210X476M6R3CT to C1210N223K050T]

## 1210X476M6R3CT
designator C?  Capacitance: 47uF  (hidden comment: *)
Capacitor, Ceramic (MLCC), 47uF, ±20%, 6.3V, X5R, ±20%, SMD 1210; Manufacturer: Walsin Tech Corp; Manufacturer Part Number: 1210X476M6R3CT; Package Size: 1210; JLCPCB Basic Part: No; JLCPCB Part Number: C515693; Supplier 1: LCSC; Category: Capacitors - MLCC; Supplier Part Number 1: C515693; Tolerance: ±20%; Voltage Rating: 6.3V; Temperature Coefficient: X5R; RoHS: Yes; ComponentLink1Description: Datasheet; ComponentLink1URL: https://wmsc.lcsc.com/wmsc/upload/file/pdf/v2/lcsc/2004240902_Walsin-Tech-Corp-1210X476M6R3CT_C515693.pdf; ComponentLink2Description: JLCPCB Part URL; ComponentLink2URL: https://jlcpcb.com/partdetail/C515693; ComponentLink3Description: LCSC Part URL; ComponentLink3URL: https://lcsc.com/product-detail/Multilayer-Ceramic-Capacitors-MLCC---SMD-SMT_Walsin-Tech-Corp-Walsin-Tech-Corp-1210X476M6R3CT_C515693.html
footprint CAP-1210 (1210 (3225M) Capacitor)
pins: 1, 2

## 1210X476M100CT
designator C?  Capacitance: 47uF  (hidden comment: *)
Capacitor, Ceramic (MLCC), 47uF, ±20%, 10V, X5R, ±20%, SMD 1210; Manufacturer: Walsin Tech Corp; Manufacturer Part Number: 1210X476M100CT; Package Size: 1210; JLCPCB Basic Part: No; JLCPCB Part Number: C515691; Supplier 1: LCSC; Category: Capacitors - MLCC; Supplier Part Number 1: C515691; Tolerance: ±20%; Voltage Rating: 10V; Temperature Coefficient: X5R; RoHS: Yes; ComponentLink1Description: Datasheet; ComponentLink1URL: https://wmsc.lcsc.com/wmsc/upload/file/pdf/v2/lcsc/2304140030_Walsin-Tech-Corp-1210X476M100CT_C515691.pdf; ComponentLink2Description: JLCPCB Part URL; ComponentLink2URL: https://jlcpcb.com/partdetail/C515691; ComponentLink3Description: LCSC Part URL; ComponentLink3URL: https://lcsc.com/product-detail/Multilayer-Ceramic-Capacitors-MLCC---SMD-SMT_Walsin-Tech-Corp-Walsin-Tech-Corp-1210X476M100CT_C515691.html
footprint CAP-1210 (1210 (3225M) Capacitor)
pins: 1, 2

## 1210YD107MAT2A
designator C?  Capacitance: 100uF  (hidden comment: *)
Capacitor, Ceramic (MLCC), 100uF, ±20%, 16V, X5R, ±20%, SMD 1210; Manufacturer: Kyocera AVX; Manufacturer Part Number: 1210YD107MAT2A; Package Size: 1210; JLCPCB Basic Part: No; JLCPCB Part Number: C2180446; Supplier 1: LCSC; Category: Capacitors - MLCC; Supplier Part Number 1: C2180446; Tolerance: ±20%; Voltage Rating: 16V; Temperature Coefficient: X5R; RoHS: Yes; ComponentLink1Description: Datasheet; ComponentLink1URL: https://wmsc.lcsc.com/wmsc/upload/file/pdf/v2/lcsc/2304140030_Kyocera-AVX-1210YD107MAT2A_C2180446.pdf; ComponentLink2Description: JLCPCB Part URL; ComponentLink2URL: https://jlcpcb.com/partdetail/C2180446; ComponentLink3Description: LCSC Part URL; ComponentLink3URL: https://lcsc.com/product-detail/Multilayer-Ceramic-Capacitors-MLCC---SMD-SMT_Kyocera-AVX-Kyocera-AVX-1210YD107MAT2A_C2180446.html
footprint CAP-1210 (1210 (3225M) Capacitor)
pins: 1, 2

## 12101C105KAT2A
designator C?  Capacitance: 1uF  (hidden comment: *)
Capacitor, Ceramic (MLCC), 1uF, ±10%, 100V, X7R, ±10%, SMD 1210; Manufacturer: AVX; Manufacturer Part Number: 12101C105KAT2A; Package Size: 1210; JLCPCB Basic Part: No; JLCPCB Part Number: C597559; Supplier 1: LCSC; Category: Capacitors - MLCC; Supplier Part Number 1: C597559; Tolerance: ±10%; Voltage Rating: 100V; Temperature Coefficient: X7R; RoHS: Yes; ComponentLink1Description: Datasheet; ComponentLink1URL: https://wmsc.lcsc.com/wmsc/upload/file/pdf/v2/lcsc/2304140030_Kyocera-AVX-12101C105KAT2A_C597559.pdf; ComponentLink2Description: JLCPCB Part URL; ComponentLink2URL: https://jlcpcb.com/partdetail/C597559; ComponentLink3Description: LCSC Part URL; ComponentLink3URL: https://lcsc.com/product-detail/Multilayer-Ceramic-Capacitors-MLCC---SMD-SMT_Kyocera-AVX-Kyocera-AVX-12101C105KAT2A_C597559.html
footprint CAP-1210 (1210 (3225M) Capacitor)
pins: 1, 2

## 12101C225KAT2A
designator C?  Capacitance: 2.2uF  (hidden comment: *)
Capacitor, Ceramic (MLCC), 2.2uF, ±10%, 100V, X7R, ±10%, SMD 1210; Manufacturer: AVX; Manufacturer Part Number: 12101C225KAT2A; Package Size: 1210; JLCPCB Basic Part: No; JLCPCB Part Number: C597563; Supplier 1: LCSC; Category: Capacitors - MLCC; Supplier Part Number 1: C597563; Tolerance: ±10%; Voltage Rating: 100V; Temperature Coefficient: X7R; RoHS: Yes; ComponentLink1Description: Datasheet; ComponentLink1URL: https://wmsc.lcsc.com/wmsc/upload/file/pdf/v2/lcsc/2304140030_Kyocera-AVX-12101C225KAT2A_C597563.pdf; ComponentLink2Description: JLCPCB Part URL; ComponentLink2URL: https://jlcpcb.com/partdetail/C597563; ComponentLink3Description: LCSC Part URL; ComponentLink3URL: https://lcsc.com/product-detail/Multilayer-Ceramic-Capacitors-MLCC---SMD-SMT_Kyocera-AVX-Kyocera-AVX-12101C225KAT2A_C597563.html
footprint CAP-1210 (1210 (3225M) Capacitor)
pins: 1, 2

## 12101C475K4T2A
designator C?  Capacitance: 4.7uF  (hidden comment: *)
Capacitor, Ceramic (MLCC), 4.7uF, ±10%, 100V, X7R, ±10%, SMD 1210; Manufacturer: Kyocera AVX; Manufacturer Part Number: 12101C475K4T2A; Package Size: 1210; JLCPCB Basic Part: No; JLCPCB Part Number: C2325876; Supplier 1: LCSC; Category: Capacitors - MLCC; Supplier Part Number 1: C2325876; Tolerance: ±10%; Voltage Rating: 100V; Temperature Coefficient: X7R; RoHS: Yes; ComponentLink1Description: Datasheet; ComponentLink1URL: https://wmsc.lcsc.com/wmsc/upload/file/pdf/v2/lcsc/2304140030_Kyocera-AVX-12101C475K4T2A_C2325876.pdf; ComponentLink2Description: JLCPCB Part URL; ComponentLink2URL: https://jlcpcb.com/partdetail/C2325876; ComponentLink3Description: LCSC Part URL; ComponentLink3URL: https://lcsc.com/product-detail/Multilayer-Ceramic-Capacitors-MLCC---SMD-SMT_Kyocera-AVX-Kyocera-AVX-12101C475K4T2A_C2325876.html
footprint CAP-1210 (1210 (3225M) Capacitor)
pins: 1, 2

## 12101C475K4Z2A
designator C?  Capacitance: 4.7uF  (hidden comment: *)
Capacitor, Ceramic (MLCC), 4.7uF, ±10%, 100V, X7R, ±10%, SMD 1210; Manufacturer: Kyocera AVX; Manufacturer Part Number: 12101C475K4Z2A; Package Size: 1210; JLCPCB Basic Part: No; JLCPCB Part Number: C1870804; Supplier 1: LCSC; Category: Capacitors - MLCC; Supplier Part Number 1: C1870804; Tolerance: ±10%; Voltage Rating: 100V; Temperature Coefficient: X7R; RoHS: Yes; ComponentLink1Description: Datasheet; ComponentLink1URL: https://wmsc.lcsc.com/wmsc/upload/file/pdf/v2/lcsc/2304140030_Kyocera-AVX-12101C475K4Z2A_C1870804.pdf; ComponentLink2Description: JLCPCB Part URL; ComponentLink2URL: https://jlcpcb.com/partdetail/C1870804; ComponentLink3Description: LCSC Part URL; ComponentLink3URL: https://lcsc.com/product-detail/Multilayer-Ceramic-Capacitors-MLCC---SMD-SMT_Kyocera-AVX-Kyocera-AVX-12101C475K4Z2A_C1870804.html
footprint CAP-1210 (1210 (3225M) Capacitor)
pins: 1, 2

## 12103D226MAT2A
designator C?  Capacitance: 22uF  (hidden comment: *)
Capacitor, Ceramic (MLCC), 22uF, ±20%, 25V, X5R, ±20%, SMD 1210; Manufacturer: Kyocera AVX; Manufacturer Part Number: 12103D226MAT2A; Package Size: 1210; JLCPCB Basic Part: No; JLCPCB Part Number: C512810; Supplier 1: LCSC; Category: Capacitors - MLCC; Supplier Part Number 1: C512810; Tolerance: ±20%; Voltage Rating: 25V; Temperature Coefficient: X5R; RoHS: Yes; ComponentLink1Description: Datasheet; ComponentLink1URL: https://wmsc.lcsc.com/wmsc/upload/file/pdf/v2/lcsc/2301302030_Kyocera-AVX-12103D226MAT2A_C512810.pdf; ComponentLink2Description: JLCPCB Part URL; ComponentLink2URL: https://jlcpcb.com/partdetail/C512810; ComponentLink3Description: LCSC Part URL; ComponentLink3URL: https://lcsc.com/product-detail/Multilayer-Ceramic-Capacitors-MLCC---SMD-SMT_Kyocera-AVX-Kyocera-AVX-12103D226MAT2A_C512810.html
footprint CAP-1210 (1210 (3225M) Capacitor)
pins: 1, 2

## 12105C106K4T2A
designator C?  Capacitance: 10uF  (hidden comment: *)
Capacitor, Ceramic (MLCC), 10uF, ±10%, 50V, X7R, ±10%, SMD 1210; Manufacturer: AVX; Manufacturer Part Number: 12105C106K4T2A; Package Size: 1210; JLCPCB Basic Part: No; JLCPCB Part Number: C597578; Supplier 1: LCSC; Category: Capacitors - MLCC; Supplier Part Number 1: C597578; Tolerance: ±10%; Voltage Rating: 50V; Temperature Coefficient: X7R; RoHS: Yes; ComponentLink1Description: Datasheet; ComponentLink1URL: https://wmsc.lcsc.com/wmsc/upload/file/pdf/v2/lcsc/2304140030_Kyocera-AVX-12105C106K4T2A_C597578.pdf; ComponentLink2Description: JLCPCB Part URL; ComponentLink2URL: https://jlcpcb.com/partdetail/C597578; ComponentLink3Description: LCSC Part URL; ComponentLink3URL: https://lcsc.com/product-detail/Multilayer-Ceramic-Capacitors-MLCC---SMD-SMT_Kyocera-AVX-Kyocera-AVX-12105C106K4T2A_C597578.html
footprint CAP-1210 (1210 (3225M) Capacitor)
pins: 1, 2

## 12105C106K4Z2A
designator C?  Capacitance: 10uF  (hidden comment: *)
Capacitor, Ceramic (MLCC), 10uF, ±10%, 50V, X7R, ±10%, SMD 1210; Manufacturer: AVX; Manufacturer Part Number: 12105C106K4Z2A; Package Size: 1210; JLCPCB Basic Part: No; JLCPCB Part Number: C597579; Supplier 1: LCSC; Category: Capacitors - MLCC; Supplier Part Number 1: C597579; Tolerance: ±10%; Voltage Rating: 50V; Temperature Coefficient: X7R; RoHS: Yes; ComponentLink1Description: Datasheet; ComponentLink1URL: https://wmsc.lcsc.com/wmsc/upload/file/pdf/v2/lcsc/2304140030_Kyocera-AVX-12105C106K4Z2A_C597579.pdf; ComponentLink2Description: JLCPCB Part URL; ComponentLink2URL: https://jlcpcb.com/partdetail/C597579; ComponentLink3Description: LCSC Part URL; ComponentLink3URL: https://lcsc.com/product-detail/Multilayer-Ceramic-Capacitors-MLCC---SMD-SMT_Kyocera-AVX-Kyocera-AVX-12105C106K4Z2A_C597579.html
footprint CAP-1210 (1210 (3225M) Capacitor)
pins: 1, 2

## 12105C106KAT2A
designator C?  Capacitance: 10uF  (hidden comment: *)
Capacitor, Ceramic (MLCC), 10uF, ±10%, 50V, X7R, ±10%, SMD 1210; Manufacturer: AVX; Manufacturer Part Number: 12105C106KAT2A; Package Size: 1210; JLCPCB Basic Part: No; JLCPCB Part Number: C597580; Supplier 1: LCSC; Category: Capacitors - MLCC; Supplier Part Number 1: C597580; Tolerance: ±10%; Voltage Rating: 50V; Temperature Coefficient: X7R; RoHS: Yes; ComponentLink1Description: Datasheet; ComponentLink1URL: https://wmsc.lcsc.com/wmsc/upload/file/pdf/v2/lcsc/2304140030_Kyocera-AVX-12105C106KAT2A_C597580.pdf; ComponentLink2Description: JLCPCB Part URL; ComponentLink2URL: https://jlcpcb.com/partdetail/C597580; ComponentLink3Description: LCSC Part URL; ComponentLink3URL: https://lcsc.com/product-detail/Multilayer-Ceramic-Capacitors-MLCC---SMD-SMT_Kyocera-AVX-Kyocera-AVX-12105C106KAT2A_C597580.html
footprint CAP-1210 (1210 (3225M) Capacitor)
pins: 1, 2

## 12105C225K4Z2A
designator C?  Capacitance: 2.2uF  (hidden comment: *)
Capacitor, Ceramic (MLCC), 2.2uF, ±10%, 50V, X7R, ±10%, SMD 1210; Manufacturer: AVX; Manufacturer Part Number: 12105C225K4Z2A; Package Size: 1210; JLCPCB Basic Part: No; JLCPCB Part Number: C779999; Supplier 1: LCSC; Category: Capacitors - MLCC; Supplier Part Number 1: C779999; Tolerance: ±10%; Voltage Rating: 50V; Temperature Coefficient: X7R; RoHS: Yes; ComponentLink1Description: Datasheet; ComponentLink1URL: https://wmsc.lcsc.com/wmsc/upload/file/pdf/v2/lcsc/2009151135_Kyocera-AVX-12105C225K4Z2A_C779999.pdf; ComponentLink2Description: JLCPCB Part URL; ComponentLink2URL: https://jlcpcb.com/partdetail/C779999; ComponentLink3Description: LCSC Part URL; ComponentLink3URL: https://lcsc.com/product-detail/Multilayer-Ceramic-Capacitors-MLCC---SMD-SMT_Kyocera-AVX-Kyocera-AVX-12105C225K4Z2A_C779999.html
footprint CAP-1210 (1210 (3225M) Capacitor)
pins: 1, 2
